# Altium footprint library QFP_QFN_DFN.PcbLib: 36 footprints (part 2 of 3)
Each footprint in its own frame and in the unit in brackets; x right, y up, seen from the top. Pads: shape width x height; smd on the part's side, far side on the other; paste and mask are expansions set on the pad; w line width, h text height; cw(c..) or ccw(c..) is an arc to the next point about the centre after c.
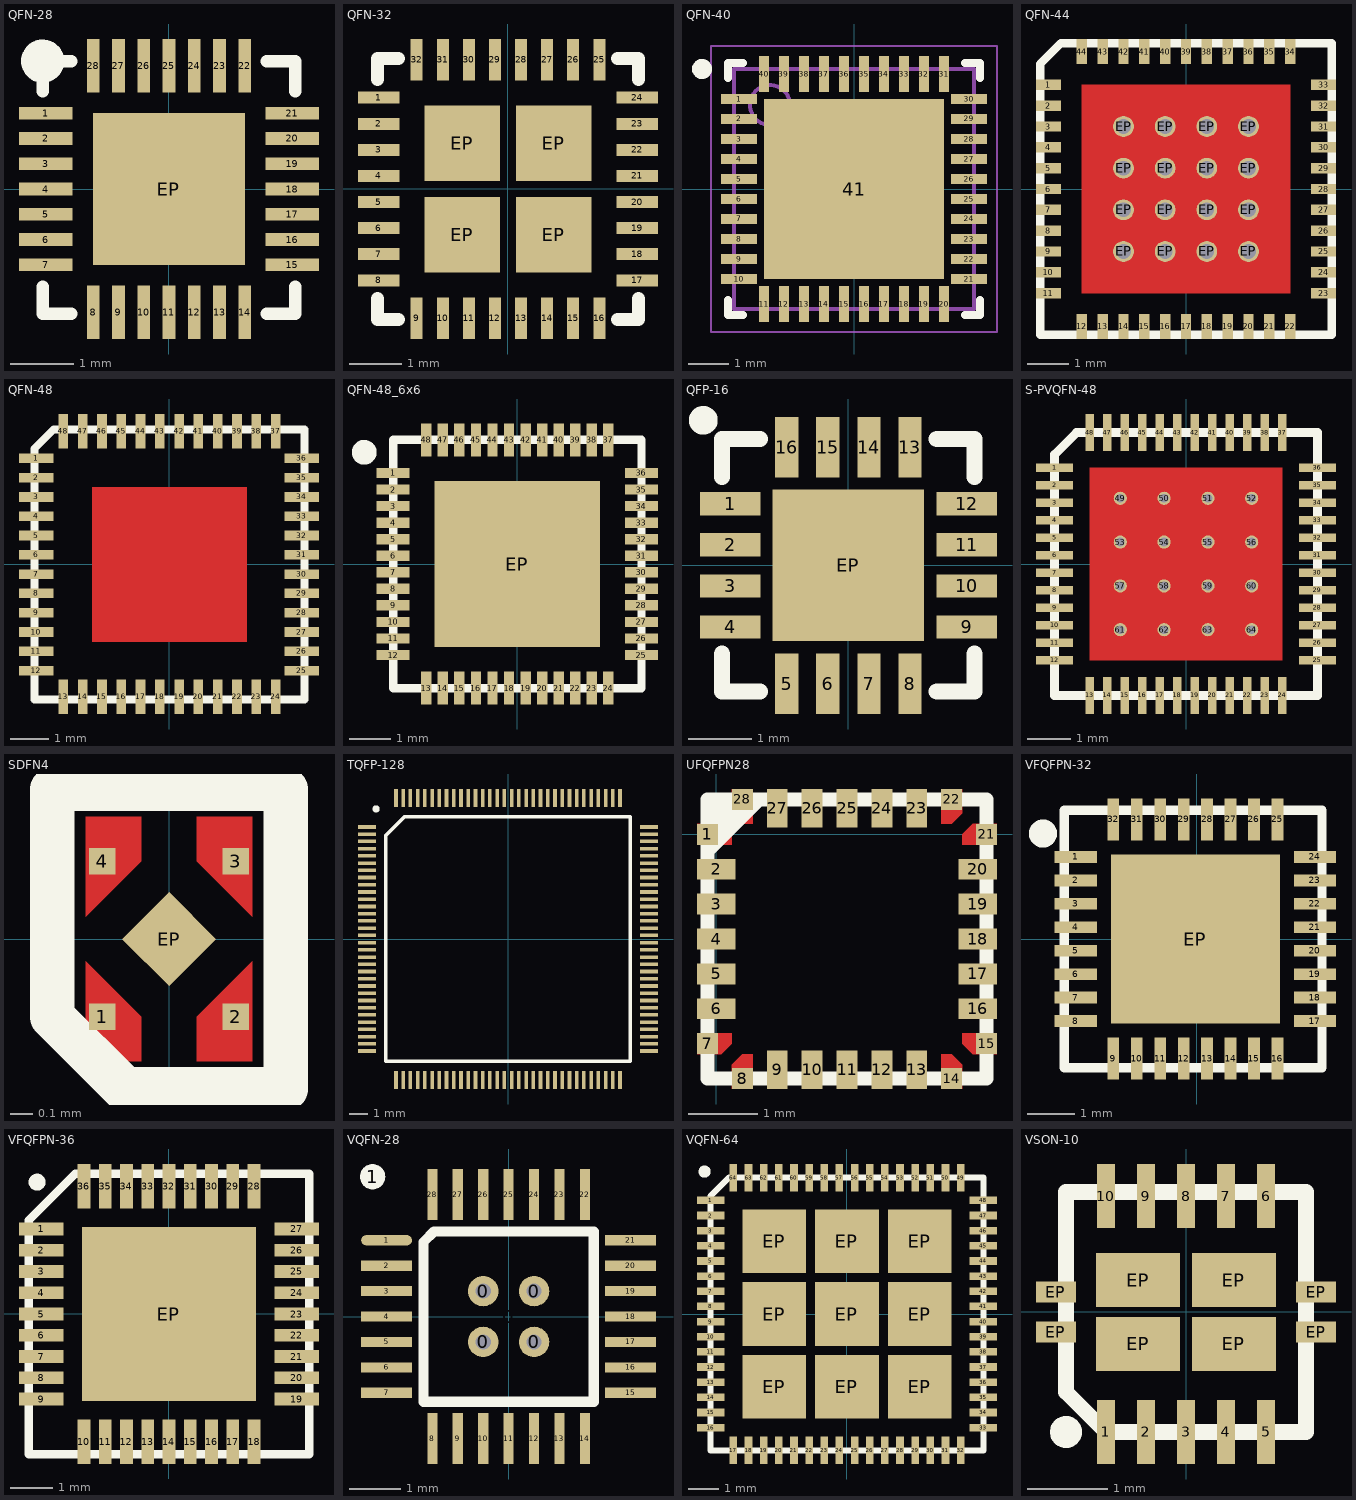
[diagram p1: the footprints below, top view; thin cyan lines are the x and y axes]

## QFN-28 [mm] "QFN-28"
pads (29):
  rect 0.85x0.2 smd: 1(-1.95,1.2) 2(-1.95,0.8) 3(-1.95,0.4) 4(-1.95,0) 5(-1.95,-0.4) 6(-1.95,-0.8) 7(-1.95,-1.2) 15(1.95,-1.2) 16(1.95,-0.8) 17(1.95,-0.4) 18(1.95,0) 19(1.95,0.4) 20(1.95,0.8) 21(1.95,1.2)
  rect 0.2x0.85 smd: 8(-1.2,-1.95) 9(-0.8,-1.95) 10(-0.4,-1.95) 11(0,-1.95) 12(0.4,-1.95) 13(0.8,-1.95) 14(1.2,-1.95) 22(1.2,1.95) 23(0.8,1.95) 24(0.4,1.95) 25(0,1.95) 26(-0.4,1.95) 27(-0.8,1.95) 28(-1.2,1.95)
  rect 2.4x2.4 smd: EP(0,0)
Top Overlay:
  circle w0.254: c-2,2.025 r0.215
  lines w0.2: -2,-1.55 -2,-1.975 -1.55,-1.975 ; -2,1.55 -2,2.025 -1.55,2.025 ; 1.55,-1.975 2,-1.975 2,-1.55 ; 1.55,2.025 2,2.025 2,1.55
3D body "User Library-QFN28-0_4.STEP": height 0.75, standoff 0, extent -2,-1.975 2,2.025

## QFN-32 [mm]
pads (36):
  rect 0.8x0.23 smd: 1(-2.475,1.75) 2(-2.475,1.25) 3(-2.475,0.75) 4(-2.475,0.25) 5(-2.475,-0.25) 6(-2.475,-0.75) 7(-2.475,-1.25) 8(-2.475,-1.75) 17(2.475,-1.75) 18(2.475,-1.25) 19(2.475,-0.75) 20(2.475,-0.25) 21(2.475,0.25) 22(2.475,0.75) 23(2.475,1.25) 24(2.475,1.75)
  rect 0.23x0.8 smd: 9(-1.75,-2.475) 10(-1.25,-2.475) 11(-0.75,-2.475) 12(-0.25,-2.475) 13(0.25,-2.475) 14(0.75,-2.475) 15(1.25,-2.475) 16(1.75,-2.475) 25(1.75,2.475) 26(1.25,2.475) 27(0.75,2.475) 28(0.25,2.475) 29(-0.25,2.475) 30(-0.75,2.475) 31(-1.25,2.475) 32(-1.75,2.475)
  rect 1.45x1.45 smd: EP(-0.875,-0.875) EP(-0.875,0.875) EP(0.875,-0.875) EP(0.875,0.875)
Top Overlay:
  lines w0.254: -2.5,-2.1 -2.5,-2.5 -2.1,-2.5 ; -2.5,2.1 -2.5,2.5 -2.1,2.5 ; 2.1,-2.5 2.5,-2.5 2.5,-2.1 ; 2.1,2.5 2.5,2.5 2.5,2.1
3D body "User Library-QFN-32-5x5 - EQ.STEP": height 0.85, standoff 0, extent -2.5,-2.5 2.5,2.5

## QFN-40 [mm] "QFN, 40-Leads, Body 6,00x6,00mm, Pitch 0,50mm, Thermal Pad 4,50x4,50mm, IPC Medium Density"
height 0.9
pads (41):
  rect 0.9x0.25 smd: 1(-2.875,2.25) 2(-2.875,1.75) 3(-2.875,1.25) 4(-2.875,0.75) 5(-2.875,0.25) 6(-2.875,-0.25) 7(-2.875,-0.75) 8(-2.875,-1.25) 9(-2.875,-1.75) 10(-2.875,-2.25) 21(2.875,-2.25) 22(2.875,-1.75) 23(2.875,-1.25) 24(2.875,-0.75) 25(2.875,-0.25) 26(2.875,0.25) 27(2.875,0.75) 28(2.875,1.25) 29(2.875,1.75) 30(2.875,2.25)
  rect 0.25x0.9 smd: 11(-2.25,-2.875) 12(-1.75,-2.875) 13(-1.25,-2.875) 14(-0.75,-2.875) 15(-0.25,-2.875) 16(0.25,-2.875) 17(0.75,-2.875) 18(1.25,-2.875) 19(1.75,-2.875) 20(2.25,-2.875) 31(2.25,2.875) 32(1.75,2.875) 33(1.25,2.875) 34(0.75,2.875) 35(0.25,2.875) 36(-0.25,2.875) 37(-0.75,2.875) 38(-1.25,2.875) 39(-1.75,2.875) 40(-2.25,2.875)
  rect 4.5x4.5 smd: 41(0,0)
Top Overlay:
  circle w0.25: c-3.8,3 r0.125
  lines w0.2: -3.15,-2.775 -3.15,-3.15 -2.775,-3.15 ; -3.15,2.775 -3.15,3.15 -2.775,3.15 ; 2.775,-3.15 3.15,-3.15 3.15,-2.775 ; 2.775,3.15 3.15,3.15 3.15,2.775
Mechanical 1:
  circle w0.1: c-2.1,2.1 r0.5
  lines w0.1: -3,-3 -3,3 3,3 3,-3 -3,-3
Mechanical 15:
  lines w0.05: -3.575,-3.575 -3.575,3.575 3.575,3.575 3.575,-3.575 -3.575,-3.575
  lines w0.1: -0.5,0 0.5,0 ; 0,-0.5 0,0.5
3D body "QFN-40.step": height 0.9, standoff 0, extent -3.01,-3.01 3.01,3.01

## QFN-44 [mm] "QFN 44pin 7x7mm"
pads (60):
  rect 0.6x0.25 smd: 1(-3.3,2.5) 2(-3.3,2) 3(-3.3,1.5) 4(-3.3,1) 5(-3.3,0.5) 6(-3.3,0) 7(-3.3,-0.5) 8(-3.3,-1) 9(-3.3,-1.5) 10(-3.3,-2) 11(-3.3,-2.5) 23(3.3,-2.5) 24(3.3,-2) 25(3.3,-1.5) 26(3.3,-1) 27(3.3,-0.5) 28(3.3,0) 29(3.3,0.5) 30(3.3,1) 31(3.3,1.5) 32(3.3,2) 33(3.3,2.5)
  rect 0.25x0.6 smd: 12(-2.5,-3.3) 13(-2,-3.3) 14(-1.5,-3.3) 15(-1,-3.3) 16(-0.5,-3.3) 17(0,-3.3) 18(0.5,-3.3) 19(1,-3.3) 20(1.5,-3.3) 21(2,-3.3) 22(2.5,-3.3) 34(2.5,3.3) 35(2,3.3) 36(1.5,3.3) 37(1,3.3) 38(0.5,3.3) 39(0,3.3) 40(-0.5,3.3) 41(-1,3.3) 42(-1.5,3.3) 43(-2,3.3) 44(-2.5,3.3)
  round 0.5 hole 0.35 paste+0 mask+0: EP(-1.5,-1.5) EP(-1.5,-0.5) EP(-1.5,0.5) EP(-1.5,1.5) EP(-0.5,-1.5) EP(-0.5,-0.5) EP(-0.5,0.5) EP(-0.5,1.5) EP(0.5,-1.5) EP(0.5,-0.5) EP(0.5,0.5) EP(0.5,1.5) EP(1.5,-1.5) EP(1.5,-0.5) EP(1.5,0.5) EP(1.5,1.5)
Top Layer:
  region: -2.5,2.5 -2.5,-2.5 2.5,-2.5 2.5,2.5
Top Overlay:
  lines w0.2: -3.5,-3.5 -3.5,3 -3,3.5 3.5,3.5 3.5,-3.5 -3.5,-3.5
Top Solder:
  region: -1.23,2.16 -2.16,2.16 -2.16,1.23 -1.23,1.23
  region: -0.1,1.23 -0.1,2.16 -1.03,2.16 -1.03,1.23
  region: 1.03,1.23 1.03,2.16 0.1,2.16 0.1,1.23
  region: 2.16,1.23 2.16,2.16 1.23,2.16 1.23,1.23
  region: -1.23,0.1 -1.23,1.03 -2.16,1.03 -2.16,0.1
  region: -0.1,0.1 -0.1,1.03 -1.03,1.03 -1.03,0.1
  region: 1.03,0.1 1.03,1.03 0.1,1.03 0.1,0.1
  region: 2.16,0.1 2.16,1.03 1.23,1.03 1.23,0.1
  region: -1.23,-1.03 -1.23,-0.1 -2.16,-0.1 -2.16,-1.03
  region: -0.1,-1.03 -0.1,-0.1 -1.03,-0.1 -1.03,-1.03
  region: 1.03,-1.03 1.03,-0.1 0.1,-0.1 0.1,-1.03
  region: 2.16,-1.03 2.16,-0.1 1.23,-0.1 1.23,-1.03
  region: -1.23,-2.16 -1.23,-1.23 -2.16,-1.23 -2.16,-2.16
  region: -0.1,-2.16 -0.1,-1.23 -1.03,-1.23 -1.03,-2.16
  region: 1.03,-2.16 1.03,-1.23 0.1,-1.23 0.1,-2.16
  region: 2.16,-2.16 2.16,-1.23 1.23,-1.23 1.23,-2.16
3D body "User Library-smd_qfn-44-2.STEP": height 0.9, standoff 0, extent -3.501,-3.501 3.501,3.501

## QFN-48 [mm]
pads (48):
  rect 0.9x0.25 smd: 1(-3.45,2.75) 2(-3.45,2.25) 3(-3.45,1.75) 4(-3.45,1.25) 5(-3.45,0.75) 6(-3.45,0.25) 7(-3.45,-0.25) 8(-3.45,-0.75) 9(-3.45,-1.25) 10(-3.45,-1.75) 11(-3.45,-2.25) 12(-3.45,-2.75) 25(3.425,-2.75) 26(3.425,-2.25) 27(3.425,-1.75) 28(3.425,-1.25) 29(3.425,-0.75) 30(3.425,-0.25) 31(3.425,0.25) 32(3.425,0.75) 33(3.425,1.25) 34(3.425,1.75) 35(3.425,2.25) 36(3.425,2.75)
  rect 0.25x0.9 smd: 13(-2.75,-3.425) 14(-2.25,-3.425) 15(-1.75,-3.425) 16(-1.25,-3.425) 17(-0.75,-3.425) 18(-0.25,-3.425) 19(0.25,-3.425) 20(0.75,-3.425) 21(1.25,-3.425) 22(1.75,-3.425) 23(2.25,-3.425) 24(2.75,-3.425) 37(2.75,3.45) 38(2.25,3.45) 39(1.75,3.45) 40(1.25,3.45) 41(0.75,3.45) 42(0.25,3.45) 43(-0.25,3.45) 44(-0.75,3.45) 45(-1.25,3.45) 46(-1.75,3.45) 47(-2.25,3.45) 48(-2.75,3.45)
Top Layer:
  region: -2,2 -2,-2 2,-2 2,2
Top Overlay:
  lines w0.2: -3.5,-3.5 -3.5,3 -3,3.5 3.5,3.5 3.5,-3.5 -3.5,-3.5
Top Solder:
  region: 2.16,-2.16 2.16,-1.23 1.23,-1.23 1.23,-2.16
  region: 1.03,-2.16 1.03,-1.23 0.1,-1.23 0.1,-2.16
  region: -0.1,-2.16 -0.1,-1.23 -1.03,-1.23 -1.03,-2.16
  region: -1.23,-2.16 -1.23,-1.23 -2.16,-1.23 -2.16,-2.16
  region: 2.16,-1.03 2.16,-0.1 1.23,-0.1 1.23,-1.03
  region: 1.03,-1.03 1.03,-0.1 0.1,-0.1 0.1,-1.03
  region: -0.1,-1.03 -0.1,-0.1 -1.03,-0.1 -1.03,-1.03
  region: -1.23,-1.03 -1.23,-0.1 -2.16,-0.1 -2.16,-1.03
  region: 2.16,0.1 2.16,1.03 1.23,1.03 1.23,0.1
  region: 1.03,0.1 1.03,1.03 0.1,1.03 0.1,0.1
  region: -0.1,0.1 -0.1,1.03 -1.03,1.03 -1.03,0.1
  region: -1.23,0.1 -1.23,1.03 -2.16,1.03 -2.16,0.1
  region: 2.16,1.23 2.16,2.16 1.23,2.16 1.23,1.23
  region: 1.03,1.23 1.03,2.16 0.1,2.16 0.1,1.23
  region: -0.1,1.23 -0.1,2.16 -1.03,2.16 -1.03,1.23
  region: -1.23,2.16 -2.16,2.16 -2.16,1.23 -1.23,1.23
3D body "User Library-QFN48_7x7.STEP": height 0.78, standoff -0.02, extent -3.5,-3.51 3.52,3.51

## QFN-48_6x6 [mm]
pads (49):
  rect 0.8x0.25 smd: 1(-3,2.2) 2(-3,1.8) 3(-3,1.4) 4(-3,1) 5(-3,0.6) 6(-3,0.2) 7(-3,-0.2) 8(-3,-0.6) 9(-3,-1) 10(-3,-1.4) 11(-3,-1.8) 12(-3,-2.2) 25(3,-2.2) 26(3,-1.8) 27(3,-1.4) 28(3,-1) 29(3,-0.6) 30(3,-0.2) 31(3,0.2) 32(3,0.6) 33(3,1) 34(3,1.4) 35(3,1.8) 36(3,2.2)
  rect 0.25x0.8 smd: 13(-2.2,-3) 14(-1.8,-3) 15(-1.4,-3) 16(-1,-3) 17(-0.6,-3) 18(-0.2,-3) 19(0.2,-3) 20(0.6,-3) 21(1,-3) 22(1.4,-3) 23(1.8,-3) 24(2.2,-3) 37(2.2,3) 38(1.8,3) 39(1.4,3) 40(1,3) 41(0.6,3) 42(0.2,3) 43(-0.2,3) 44(-0.6,3) 45(-1,3) 46(-1.4,3) 47(-1.8,3) 48(-2.2,3)
  rect 4x4 smd: EP(0,0)
Top Overlay:
  circle w0.3: c-3.7,2.7 r0.15
  lines w0.2: -3,-3 -3,3 3,3 3,-3 -3,-3
3D body "User Library-QFN48.step": height 0.85, standoff -0.02, extent -3.021,-3.016 3.019,3.024

## QFP-16 [mm]
pads (17):
  rect 0.96x0.37 smd: 1(-1.875,0.975) 2(-1.875,0.325) 3(-1.875,-0.325) 4(-1.875,-0.975) 9(1.875,-0.975) 10(1.875,-0.325) 11(1.875,0.325) 12(1.875,0.975)
  rect 0.37x0.96 smd: 5(-0.975,-1.875) 6(-0.325,-1.875) 7(0.325,-1.875) 8(0.975,-1.875) 13(0.975,1.875) 14(0.325,1.875) 15(-0.325,1.875) 16(-0.975,1.875)
  rect 2.4x2.4 smd: EP(0,0)
Top Overlay:
  circle w0.254: c-2.3,2.3 r0.1
  lines w0.254: -2,-1.4 -2,-2 -1.4,-2 ; -2,1.4 -2,2 -1.4,2 ; 1.4,-2 2,-2 2,-1.4 ; 1.4,2 2,2 2,1.4
3D body "User Library-qfn16-4x4with pad.STEP": height 0.92, standoff 0, extent -2,-2 2,2

## S-PVQFN-48 [mm] "S-PVQFN 48pin TI package"
pads (64):
  rect 0.85x0.2 smd: 1(-3,2.2) 2(-3,1.8) 3(-3,1.4) 4(-3,1) 5(-3,0.6) 6(-3,0.2) 7(-3,-0.2) 8(-3,-0.6) 9(-3,-1) 10(-3,-1.4) 11(-3,-1.8) 12(-3,-2.2) 25(3,-2.2) 26(3,-1.8) 27(3,-1.4) 28(3,-1) 29(3,-0.6) 30(3,-0.2) 31(3,0.2) 32(3,0.6) 33(3,1) 34(3,1.4) 35(3,1.8) 36(3,2.2)
  rect 0.2x0.85 smd: 13(-2.2,-3) 14(-1.8,-3) 15(-1.4,-3) 16(-1,-3) 17(-0.6,-3) 18(-0.2,-3) 19(0.2,-3) 20(0.6,-3) 21(1,-3) 22(1.4,-3) 23(1.8,-3) 24(2.2,-3) 37(2.2,3) 38(1.8,3) 39(1.4,3) 40(1,3) 41(0.6,3) 42(0.2,3) 43(-0.2,3) 44(-0.6,3) 45(-1,3) 46(-1.4,3) 47(-1.8,3) 48(-2.2,3)
  round 0.3 hole 0.2 paste+0 mask+0: 49(-1.5,1.5) 50(-0.5,1.5) 51(0.5,1.5) 52(1.5,1.5) 53(-1.5,0.5) 54(-0.5,0.5) 55(0.5,0.5) 56(1.5,0.5) 57(-1.5,-0.5) 58(-0.5,-0.5) 59(0.5,-0.5) 60(1.5,-0.5) 61(-1.5,-1.5) 62(-0.5,-1.5) 63(0.5,-1.5) 64(1.5,-1.5)
Top Layer:
  rectangle: -2.2,-2.2 2.2,2.2
Top Overlay:
  lines w0.2: -3,-3 3,-3 3,3 -2.5,3 -3,2.5 -3,-3
Top Solder:
  rectangle: -2.3,-2.3 2.3,2.3
3D body "User Library-PVQFN-N48.STEP": height 0.95, standoff -0.05, extent -3,-3 3.02,3.02

## SDFN4 [mm]
pads (5):
  rect 0.12x0.12 smd: 1(-0.3,-0.35) 2(0.3,-0.35) 3(0.3,0.35) 4(-0.3,0.35)
  rect 0.3x0.3 smd rot 45 mask+0: EP(0,0)
Top Layer:
  region: 0.375,-0.1 0.375,-0.55 0.125,-0.55 0.125,-0.35
  region: 0.375,0.1 0.375,0.55 0.125,0.55 0.125,0.35
  region: -0.375,0.1 -0.375,0.55 -0.125,0.55 -0.125,0.35
  region: -0.375,-0.1 -0.375,-0.55 -0.125,-0.55 -0.125,-0.35
Top Overlay:
  lines w0.2: -0.525,-0.35 -0.525,0.675 0.525,0.675 0.525,-0.675 -0.2,-0.675 -0.525,-0.35
Top Solder:
  rectangle: -0.5,-0.5 0.5,0.5
3D body: height 0.38, standoff 0, extent -0.4,-0.4 0.4,0.4

## TQFP-128 [mm]
pads (128):
  rect 1x0.2 smd: 1(-7.8,6.2) 2(-7.8,5.8) 3(-7.8,5.4) 4(-7.8,5) 5(-7.8,4.6) 6(-7.8,4.2) 7(-7.8,3.8) 8(-7.8,3.4) 9(-7.8,3) 10(-7.8,2.6) 11(-7.8,2.2) 12(-7.8,1.8) 13(-7.8,1.4) 14(-7.8,1) 15(-7.8,0.6) 16(-7.8,0.2) 17(-7.8,-0.2) 18(-7.8,-0.6) 19(-7.8,-1) 20(-7.8,-1.4) 21(-7.8,-1.8) 22(-7.8,-2.2) 23(-7.8,-2.6) 24(-7.8,-3) 25(-7.8,-3.4) 26(-7.8,-3.8) 27(-7.8,-4.2) 28(-7.8,-4.6) 29(-7.8,-5) 30(-7.8,-5.4) 31(-7.8,-5.8) 32(-7.8,-6.2) 65(7.8,-6.2) 66(7.8,-5.8) 67(7.8,-5.4) 68(7.8,-5) 69(7.8,-4.6) 70(7.8,-4.2) 71(7.8,-3.8) 72(7.8,-3.4) 73(7.8,-3) 74(7.8,-2.6) 75(7.8,-2.2) 76(7.8,-1.8) 77(7.8,-1.4) 78(7.8,-1) 79(7.8,-0.6) 80(7.8,-0.2) 81(7.8,0.2) 82(7.8,0.6) 83(7.8,1) 84(7.8,1.4) 85(7.8,1.8) 86(7.8,2.2) 87(7.8,2.6) 88(7.8,3) 89(7.8,3.4) 90(7.8,3.8) 91(7.8,4.2) 92(7.8,4.6) 93(7.8,5) 94(7.8,5.4) 95(7.8,5.8) 96(7.8,6.2)
  rect 0.2x1 smd: 33(-6.2,-7.8) 34(-5.8,-7.8) 35(-5.4,-7.8) 36(-5,-7.8) 37(-4.6,-7.8) 38(-4.2,-7.8) 39(-3.8,-7.8) 40(-3.4,-7.8) 41(-3,-7.8) 42(-2.6,-7.8) 43(-2.2,-7.8) 44(-1.8,-7.8) 45(-1.4,-7.8) 46(-1,-7.8) 47(-0.6,-7.8) 48(-0.2,-7.8) 49(0.2,-7.8) 50(0.6,-7.8) 51(1,-7.8) 52(1.4,-7.8) 53(1.8,-7.8) 54(2.2,-7.8) 55(2.6,-7.8) 56(3,-7.8) 57(3.4,-7.8) 58(3.8,-7.8) 59(4.2,-7.8) 60(4.6,-7.8) 61(5,-7.8) 62(5.4,-7.8) 63(5.8,-7.8) 64(6.2,-7.8) 97(6.2,7.8) 98(5.8,7.8) 99(5.4,7.8) 100(5,7.8) 101(4.6,7.8) 102(4.2,7.8) 103(3.8,7.8) 104(3.4,7.8) 105(3,7.8) 106(2.6,7.8) 107(2.2,7.8) 108(1.8,7.8) 109(1.4,7.8) 110(1,7.8) 111(0.6,7.8) 112(0.2,7.8) 113(-0.2,7.8) 114(-0.6,7.8) 115(-1,7.8) 116(-1.4,7.8) 117(-1.8,7.8) 118(-2.2,7.8) 119(-2.6,7.8) 120(-3,7.8) 121(-3.4,7.8) 122(-3.8,7.8) 123(-4.2,7.8) 124(-4.6,7.8) 125(-5,7.8) 126(-5.4,7.8) 127(-5.8,7.8) 128(-6.2,7.8)
Top Overlay:
  circle w0.2: c-7.3,7.2 r0.1
  lines w0.2: -6.765,-6.765 6.765,-6.765 6.765,6.765 -5.73,6.765 -6.765,5.73 -6.765,-6.765
3D body "User Library-TQFP128.step": height 1.1, standoff 0, extent -8.009,-8.009 8.009,8.009

## UFQFPN28 [mm]
pads (28):
  rect 0.3x0.3 smd: 1(-0.125,0) 7(-0.125,-3) 8(0.375,-3.5) 14(3.375,-3.5) 15(3.875,-3) 21(3.875,0) 22(3.375,0.5) 28(0.375,0.5)
  rect 0.55x0.3 smd: 2(0,-0.5) 3(0,-1) 4(0,-1.5) 5(0,-2) 6(0,-2.5) 16(3.75,-2.5) 17(3.75,-2) 18(3.75,-1.5) 19(3.75,-1) 20(3.75,-0.5)
  rect 0.3x0.55 smd: 9(0.875,-3.375) 10(1.375,-3.375) 11(1.875,-3.375) 12(2.375,-3.375) 13(2.875,-3.375) 23(2.875,0.375) 24(2.375,0.375) 25(1.875,0.375) 26(1.375,0.375) 27(0.875,0.375)
Top Layer:
  region: 0.225,0.65 0.225,0.3 0.375,0.15 0.525,0.15 0.525,0.65
  region: -0.275,0.15 0.075,0.15 0.225,0 0.225,-0.15 -0.275,-0.15
  region: 0.225,-3.65 0.225,-3.3 0.375,-3.15 0.525,-3.15 0.525,-3.65
  region: -0.275,-3.15 0.075,-3.15 0.225,-3 0.225,-2.85 -0.275,-2.85
  region: 4.025,-3.15 3.675,-3.15 3.525,-3 3.525,-2.85 4.025,-2.85
  region: 3.525,-3.65 3.525,-3.3 3.375,-3.15 3.225,-3.15 3.225,-3.65
  region: 3.525,0.65 3.525,0.3 3.375,0.15 3.225,0.15 3.225,0.65
  region: 4.025,0.15 3.675,0.15 3.525,0 3.525,-0.15 4.025,-0.15
  lines w0: 0.075,0.3 0.075,0.3
Top Overlay:
  region: -0.125,0.5 -0.125,-0.375 0.75,0.5
  lines w0.2: -0.125,-3.5 3.875,-3.5 3.875,0.5 -0.125,0.5 -0.125,-3.5
3D body "User Library-qfn20-4x4.step": height 0.92, standoff 0, extent -0.125,-3.5 3.875,0.5

## VFQFPN-32 [mm]
pads (33):
  rect 0.9x0.25 smd: 1(-2.575,1.75) 2(-2.575,1.25) 3(-2.575,0.75) 4(-2.575,0.25) 5(-2.575,-0.25) 6(-2.575,-0.75) 7(-2.575,-1.25) 8(-2.575,-1.75) 17(2.525,-1.75) 18(2.525,-1.25) 19(2.525,-0.75) 20(2.525,-0.25) 21(2.525,0.25) 22(2.525,0.75) 23(2.525,1.25) 24(2.525,1.75)
  rect 0.25x0.9 smd: 9(-1.775,-2.55) 10(-1.275,-2.55) 11(-0.775,-2.55) 12(-0.275,-2.55) 13(0.225,-2.55) 14(0.725,-2.55) 15(1.225,-2.55) 16(1.725,-2.55) 25(1.725,2.55) 26(1.225,2.55) 27(0.725,2.55) 28(0.225,2.55) 29(-0.275,2.55) 30(-0.775,2.55) 31(-1.275,2.55) 32(-1.775,2.55)
  rect 3.6x3.6 smd: EP(-0.025,0)
Top Overlay:
  circle w0.3: c-3.275,2.25 r0.15
  lines w0.2: -2.825,-2.75 2.675,-2.75 2.675,2.75 -2.825,2.75 -2.825,-2.75
3D body "User Library-QFN-32-5x5 - EQ.STEP": height 0.85, standoff 0, extent -2.575,-2.5 2.425,2.5

## VFQFPN-36 [mm] "VFQFPN-36 package"
pads (37):
  rect 1.05x0.3 smd paste+0: 1(-3,2) 2(-3,1.5) 3(-3,1) 4(-3,0.5) 5(-3,0) 6(-3,-0.5) 7(-3,-1) 8(-3,-1.5) 9(-3,-2) 19(3,-2) 20(3,-1.5) 21(3,-1) 22(3,-0.5) 23(3,0) 24(3,0.5) 25(3,1) 26(3,1.5) 27(3,2)
  rect 0.3x1.05 smd paste+0: 10(-2,-3) 11(-1.5,-3) 12(-1,-3) 13(-0.5,-3) 14(0,-3) 15(0.5,-3) 16(1,-3) 17(1.5,-3) 18(2,-3) 28(2,3) 29(1.5,3) 30(1,3) 31(0.5,3) 32(0,3) 33(-0.5,3) 34(-1,3) 35(-1.5,3) 36(-2,3)
  rect 4.1x4.1 smd paste+0: EP(0,0)
Top Overlay:
  circle w0.2: c-3.1,3.1 r0.1
  lines w0.2: -3.3,-3.3 -3.3,2.2 -2.2,3.3 3.3,3.3 3.3,-3.3 -3.3,-3.3
3D body "User Library-QFN36 (6x6).STEP": height 0.9, standoff 0.01, extent -3.102,-3.103 3.103,3.103

## VQFN-28 [mm]
pads (34):
  round 0.6 hole 0.3: 0(-0.5,-0.5) 0(-0.5,0.5) 0(0.5,-0.5) 0(0.5,0.5)
  round 0.5 on Top Solder: 0(0,0)
  round 0.5 on Top Overlay: 1(-2.675,2.75)
  oval 1x0.2 smd: 1(-2.4,1.5)
  rect 1x0.2 smd: 2(-2.4,1) 3(-2.4,0.5) 4(-2.4,0) 5(-2.4,-0.5) 6(-2.4,-1) 7(-2.4,-1.5) 15(2.4,-1.5) 16(2.4,-1) 17(2.4,-0.5) 18(2.4,0) 19(2.4,0.5) 20(2.4,1) 21(2.4,1.5)
  rect 0.2x1 smd: 8(-1.5,-2.4) 9(-1,-2.4) 10(-0.5,-2.4) 11(0,-2.4) 12(0.5,-2.4) 13(1,-2.4) 14(1.5,-2.4) 22(1.5,2.4) 23(1,2.4) 24(0.5,2.4) 25(0,2.4) 26(-0.5,2.4) 27(-1,2.4) 28(-1.5,2.4)
Top Overlay:
  lines w0.2: -1.675,-1.675 1.675,-1.675 1.675,1.675 -1.465,1.675 -1.675,1.465 -1.675,-1.675
Top Solder:
  rectangle: -0.5,-1.5 0.5,-0.95
  rectangle: -1.5,-1.5 -0.8,-0.8
  rectangle: -1.5,-0.5 -0.95,0.5
  rectangle: -1.5,0.8 -0.8,1.5
  rectangle: -0.5,0.95 0.5,1.5
  rectangle: 0.8,0.8 1.5,1.5
  rectangle: 0.8,-1.5 1.5,-0.8
  rectangle: 0.95,-0.5 1.5,0.5
3D body "User Library-ATmega 168.STEP": height 0.02, standoff -0.8, extent -2.002,-2.002 2,2

## VQFN-64 [mm]
pads (73):
  rect 0.9x0.25 smd: 1(-4.5,3.75) 2(-4.5,3.25) 3(-4.5,2.75) 4(-4.5,2.25) 5(-4.5,1.75) 6(-4.5,1.25) 7(-4.5,0.75) 8(-4.5,0.25) 9(-4.5,-0.25) 10(-4.5,-0.75) 11(-4.5,-1.25) 12(-4.5,-1.75) 13(-4.5,-2.25) 14(-4.5,-2.75) 15(-4.5,-3.25) 16(-4.5,-3.75) 33(4.5,-3.75) 34(4.5,-3.25) 35(4.5,-2.75) 36(4.5,-2.25) 37(4.5,-1.75) 38(4.5,-1.25) 39(4.5,-0.75) 40(4.5,-0.25) 41(4.5,0.25) 42(4.5,0.75) 43(4.5,1.25) 44(4.5,1.75) 45(4.5,2.25) 46(4.5,2.75) 47(4.5,3.25) 48(4.5,3.75)
  rect 0.25x0.9 smd: 17(-3.75,-4.5) 18(-3.25,-4.5) 19(-2.75,-4.5) 20(-2.25,-4.5) 21(-1.75,-4.5) 22(-1.25,-4.5) 23(-0.75,-4.5) 24(-0.25,-4.5) 25(0.25,-4.5) 26(0.75,-4.5) 27(1.25,-4.5) 28(1.75,-4.5) 29(2.25,-4.5) 30(2.75,-4.5) 31(3.25,-4.5) 32(3.75,-4.5) 49(3.75,4.5) 50(3.25,4.5) 51(2.75,4.5) 52(2.25,4.5) 53(1.75,4.5) 54(1.25,4.5) 55(0.75,4.5) 56(0.25,4.5) 57(-0.25,4.5) 58(-0.75,4.5) 59(-1.25,4.5) 60(-1.75,4.5) 61(-2.25,4.5) 62(-2.75,4.5) 63(-3.25,4.5) 64(-3.75,4.5)
  rect 2.1x2.1 smd mask+0.2: EP(-2.4,-2.4) EP(-2.4,0) EP(-2.4,2.4) EP(0,-2.4) EP(0,0) EP(0,2.4) EP(2.4,-2.4) EP(2.4,0) EP(2.4,2.4)
Top Overlay:
  circle w0.2: c-4.7,4.7 r0.1
  lines w0.2: -4.5,-4.5 -4.5,3.9 -3.9,4.5 4.5,4.5 4.5,-4.5 -4.5,-4.5
3D body "User Library-vqfn-64.STEP": height 1.05, standoff 0, extent -4.56,-4.575 4.61,4.595

## VSON-10 [mm]
pads (18):
  rect 0.23x0.8 smd: 1(-1,-1.5) 2(-0.5,-1.5) 3(0,-1.5) 4(0.5,-1.5) 5(1,-1.5) 6(1,1.45) 7(0.5,1.45) 8(0,1.45) 9(-0.5,1.45) 10(-1,1.45)
  rect 0.5x0.26 smd: EP(-1.625,-0.25) EP(-1.625,0.25) EP(1.625,-0.25) EP(1.625,0.25)
  rect 1.05x0.68 smd: EP(-0.6,-0.4) EP(-0.6,0.4) EP(0.6,-0.4) EP(0.6,0.4)
Top Overlay:
  circle w0.2: c-1.5,-1.5 r0.1
  lines w0.2: -1.5,-1 -1.5,1.5 1.5,1.5 1.5,-1.5 -1,-1.5 -1.5,-1
3D body "User Library-TPS74801.step": height 0.95, standoff -0.05, extent -1.5,-1.5 1.5,1.5